# Altium footprint library custom.PcbLib: 317 footprints (part 5 of 20)
Each footprint in its own frame and in the unit in brackets; x right, y up, seen from the top. Pads: shape width x height; smd on the part's side, far side on the other; paste and mask are expansions set on the pad; w line width, h text height; cw(c..) or ccw(c..) is an arc to the next point about the centre after c.
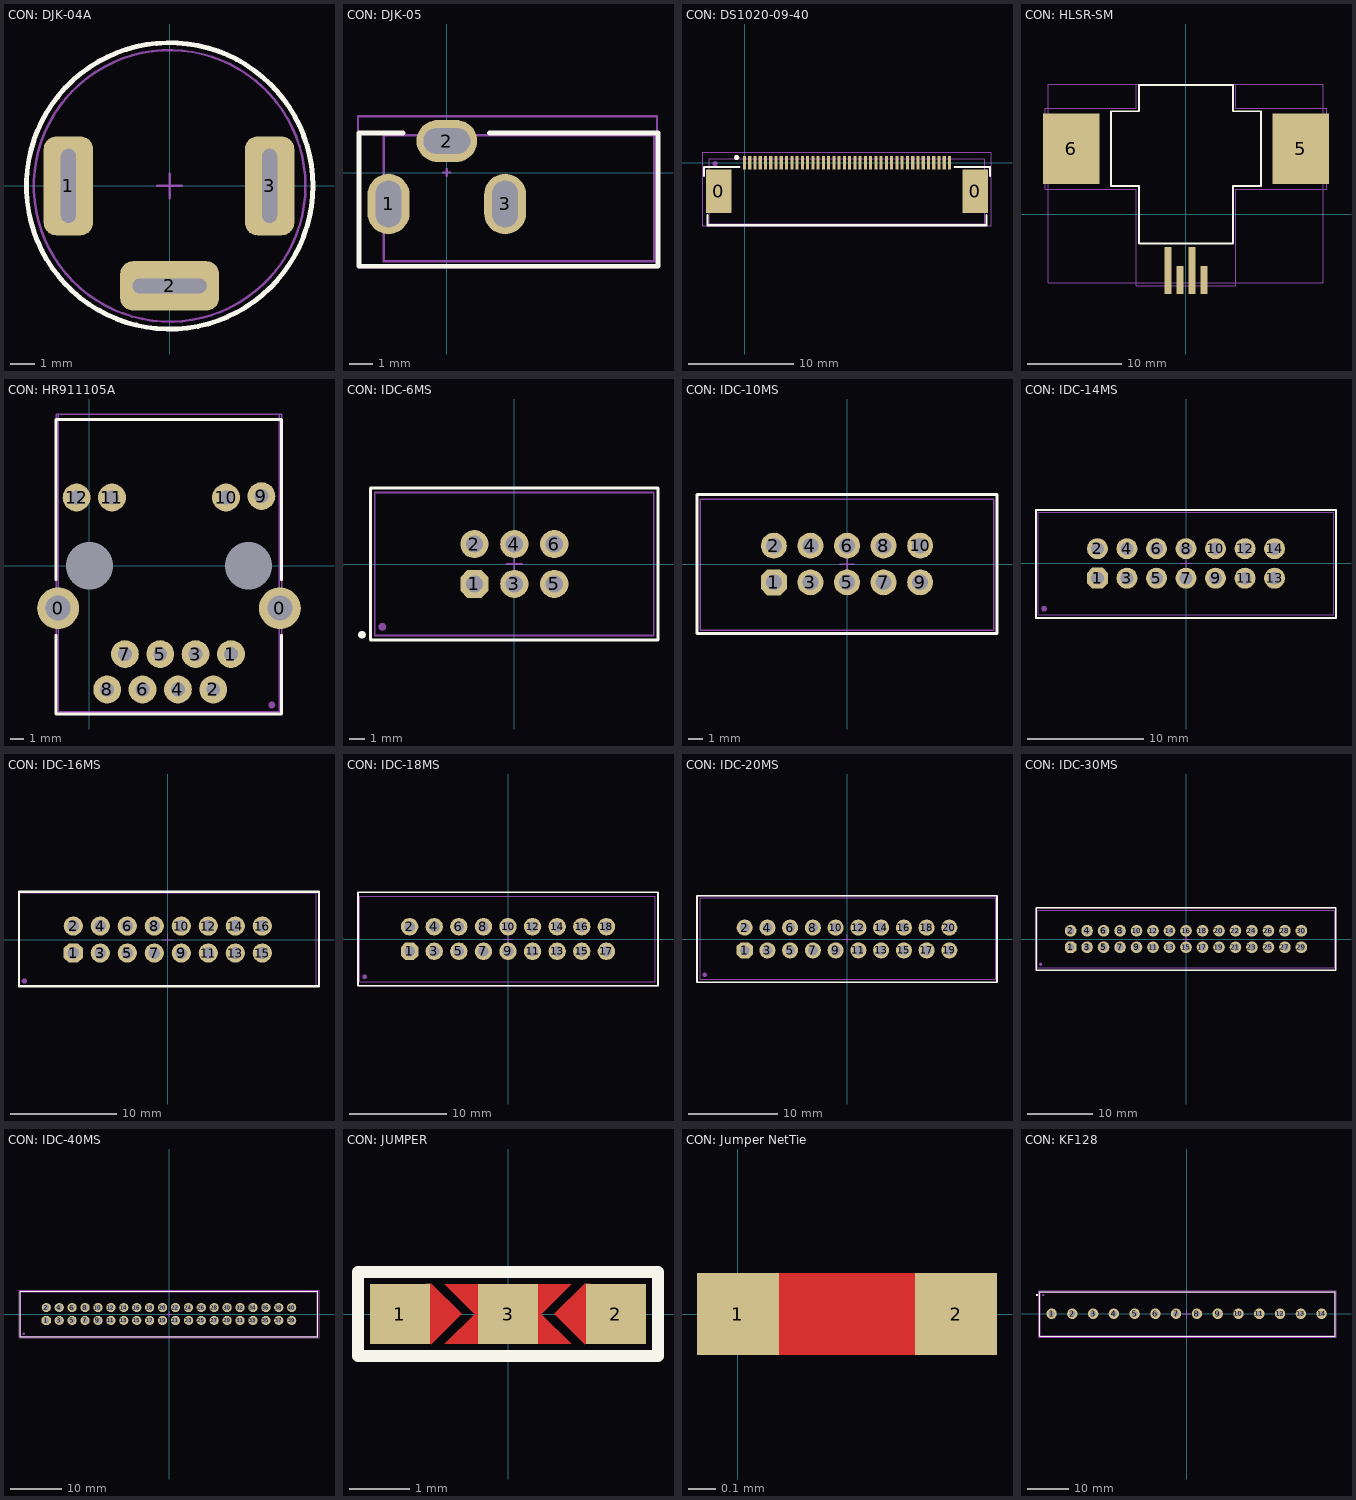
[diagram p4: the footprints below, top view; thin cyan lines are the x and y axes]

## CON: DJK-04A [mm]
height 15
pads (3):
  rrect50% 2x4 hole 0.6 slot 3 at 90 deg: 1(-4.1,0) 3(4.05,0)
  rrect50% 4x2 hole 0.6 slot 3 at 0 deg: 2(0,-4.05)
Top Overlay:
  circle w0.2: c0,0 r5.8
Top Assy:
  circle w0.1: c0,0 r5.5
Size Area:
  circle w0.1: c0,0 r5.8
  lines w0.1: -0.5,0 0.5,0 ; 0,-0.5 0,0.5
3D body "DJK-04.STEP": height 15, standoff -6, extent -5.5,-5.5 5.5,5.5

## CON: DJK-05 [mm]
height 8
pads (3):
  oval 1.8x2.6 hole 1.1 slot 2 at 90 deg: 1(-2.5,-1.35) 3(2.5,-1.35)
  oval 2.6x1.8 hole 1.1 slot 2 at 0 deg: 2(0,1.35)
Top Overlay:
  lines w0.2: -1.865,1.698 -3.77,1.698 -3.77,-4.017 9.057,-4.017 9.057,1.698 1.818,1.698
Top Assy:
  lines w0.1: -2.7,-3.8 -2.7,1.6 8.9,1.6 8.9,-3.8 -2.7,-3.8
Size Area:
  lines w0.1: -0.15,0 0.15,0 ; 0,-0.15 0,0.15 ; -3.81,-4.064 9.017,-4.064 9.017,2.413 -3.81,2.413 -3.81,-4.064
3D body "DJK-05.STEP": height 7.3, standoff -3.2, extent -2.71,-3.85 8.89,1.55

## CON: DS1020-09-40 [mm]
pads (44):
  rect 2.4x4.15 smd: 0(-2.45,-2.7) 0(21.95,-2.7)
  rect 0.3x1.25 smd: 1(0,0) 2(0.5,0) 3(1,0) 4(1.5,0) 5(2,0) 6(2.5,0) 7(3,0) 8(3.5,0) 9(4,0) 10(4.5,0) 11(5,0) 12(5.5,0) 13(6,0) 14(6.5,0) 15(7,0) 16(7.5,0) 17(8,0) 18(8.5,0) 19(9,0) 20(9.5,0) 21(10,0) 22(10.5,0) 23(11,0) 24(11.5,0) 25(12,0) 26(12.5,0) 27(13,0) 28(13.5,0) 29(14,0) 30(14.5,0) 31(15,0) 32(15.5,0) 33(16,0) 34(16.5,0) 35(17,0) 36(17.5,0) 37(18,0) 38(18.5,0) 39(19,0) 40(19.5,0)
  round 0.5 on Mech1: ""(-2.8,-0.1)
  round 0.5 on Top Overlay: ""(-0.75,0.5)
Top Overlay:
  lines w0.2: -3.875,-1.25 -3.875,-0.4 -3.85,-0.4 -3.8,-0.4 -0.5,-0.4 ; -3.525,-5 -3.525,-5.95 23,-5.95 23.025,-5.95 23.025,-5 ; 20,-0.4 23.3,-0.4 23.35,-0.4 23.375,-0.4 23.375,-1.25
Top Assy:
  lines w0.1: -3.375,-5.8 22.875,-5.8 22.875,0.4 -3.375,0.4 -3.375,-5.8
Size Area:
  lines w0.1: -4,-6 23.5,-6 23.5,1 -4,1 -4,-6
3D body "4-1734844-0.stp": height 1.88, standoff -0.02, extent -3.375,-5.8 22.875,0.4

## CON: HLSR-SM [mm] "Current transducer"
height 12.5
pads (6):
  rect 0.75x5 smd: 1(-1.905,-6) 3(0.635,-6)
  rect 0.75x3 smd: 2(-0.635,-7) 4(1.905,-7)
  rect 6x7.5 smd: 5(12.25,7) 6(-12.25,7)
Top Overlay:
  lines w0.2: -8,3 -5,3 -5,-3.1 5,-3.1 5,3 8,3 8,11 5,11 5,13.8 -5,13.8 -5,11 -8,11 -8,3
Top Assy:
  lines w0.1: -14.677,-7.325 -14.677,13.875 14.625,13.875 14.625,-7.325 -14.677,-7.325
Size Area:
  lines w0.1: -15,2.7 -15,11.3 -5.3,11.3 -5.3,13.9 5.3,13.9 5.3,11.3 15,11.3 15,2.7 5.3,2.7 5.3,-7.6 -5.3,-7.6 -5.3,2.7 -15,2.7
3D body "������ ���� HLSR 32-SM.STEP": height 12, standoff 0, extent -14.677,-7.325 14.618,13.875

## CON: HR911105A [mm]
height 14
pads (17):
  round 3 hole 1.8: 0(-2.25,-3.05) 0(13.68,-3.05)
  oval 0.7x0 hole 3.4: 0(0,0) 0(11.43,0)
  round 2 hole 1: 1(10.165,-6.35) 2(8.895,-8.89) 3(7.625,-6.35) 4(6.355,-8.89) 5(5.085,-6.35) 6(3.815,-8.89) 7(2.545,-6.35) 8(1.275,-8.89) 9(12.35,5) 10(9.81,4.9) 11(1.62,4.9) 12(-0.92,4.9)
  round 0.5 on Mech1: ""(13.1,-10)
Top Overlay:
  lines w0.2: -2.4,-5 -2.4,-10.65 13.8,-10.65 13.8,-5 ; -2.4,-1 -2.4,10.5 13.8,10.5 13.8,-1
Top Assy:
  lines w0.1: -2.24,-10.5 13.64,-10.5 13.64,10.9 -2.24,10.9 -2.24,-10.5
Size Area:
  lines w0.1: -2.4,-10.6 13.8,-10.6 13.8,10.9 -2.4,10.9 -2.4,-1 -2.4,-10.6
3D body "User Library-HR911105A.STEP": height 13.6, standoff -2.9, extent -2.24,-10.5 13.64,10.9

## CON: IDC-6MS [mm] "IDC-6MS 6 pin PCB-mount connector"
height 10
pads (8):
  oct 1.8x1.8 hole 1.1: 1(-2.54,-1.27)
  round 1.8 hole 1.1: 2(-2.54,1.27) 3(0,-1.27) 4(0,1.27) 5(2.54,-1.27) 6(2.54,1.27)
  round 0.5 on Mech1: 36(-8.4,-4)
  round 0.5 on Top Overlay: 37(-9.7,-4.5)
Top Overlay:
  lines w0.2: -9.144,-4.826 -9.144,4.826 9.144,4.826 9.144,-4.826 -9.144,-4.826
Top Assy:
  lines w0.1: -8.89,-4.55 8.87,-4.55 8.87,4.55 -8.89,4.55 -8.89,-4.55
Size Area:
  lines w0.1: -0.5,0 0.5,0 ; 0,-0.5 0,0.5 ; -9.144,-4.826 -9.144,4.826 9.144,4.826 9.144,-4.826 -9.144,-4.826
3D body "IDC-6MS.STEP": height 9, standoff -3, extent -8.89,-4.55 8.87,4.55

## CON: IDC-10MS [mm] "IDC-10MS 10 pin PCB-mount header"
height 10
pads (10):
  oct 1.8x1.8 hole 1.1: 1(-5.08,-1.27)
  round 1.8 hole 1.1: 2(-5.08,1.27) 3(-2.54,-1.27) 4(-2.54,1.27) 5(0,-1.27) 6(0,1.27) 7(2.54,-1.27) 8(2.54,1.27) 9(5.08,-1.27) 10(5.08,1.27)
Top Overlay:
  lines w0.2: -10.414,-4.826 10.414,-4.826 10.414,4.826 -10.414,4.826 -10.414,-4.826
Top Assy:
  lines w0.1: -10.2,-4.6 -10.2,4.5 10.2,4.5 10.2,-4.6 -10.2,-4.6
Size Area:
  lines w0.1: -0.5,0 0.5,0 ; 0,-0.5 0,0.5 ; -10.414,-4.826 10.414,-4.826 10.414,4.826 -10.414,4.826 -10.414,-4.826
3D body "IDC-10MS.STEP": height 9, standoff -3.1, extent -10.14,-4.572 10.16,4.528

## CON: IDC-14MS [mm] "IDC-14MS connector"
height 9
pads (15):
  oct 1.8x1.8 hole 1.1: 1(-7.62,-1.27)
  round 1.8 hole 1.1: 2(-7.62,1.27) 3(-5.08,-1.27) 4(-5.08,1.27) 5(-2.54,-1.27) 6(-2.54,1.27) 7(0,-1.27) 8(0,1.27) 9(2.54,-1.27) 10(2.54,1.27) 11(5.08,-1.27) 12(5.08,1.27) 13(7.62,-1.27) 14(7.62,1.27)
  round 0.5 on Mech1: 38(-12.2,-3.9)
Top Overlay:
  lines w0.2: -12.9,-4.7 -12.9,4.6 12.9,4.6 12.9,-4.7 -12.9,-4.7
Top Assy:
  lines w0.1: -12.7,-4.4 12.7,-4.4 12.7,4.4 -12.7,4.4 -12.7,-4.4
Size Area:
  lines w0.1: -0.5,0 0.5,0 ; 0,-0.5 0,0.5 ; -12.9,-4.7 -12.9,4.6 12.9,4.6 12.9,-4.7 -12.9,-4.7
3D body "IDC-14MS.STEP": height 9.1, standoff -3, extent -12.715,-4.4 12.715,4.4

## CON: IDC-16MS [mm] "IDC-16MS straight leads pcb mount"
height 9
pads (17):
  oct 1.8x1.8 hole 1.1: 1(-8.89,-1.27)
  round 1.8 hole 1.1: 2(-8.89,1.27) 3(-6.35,-1.27) 4(-6.35,1.27) 5(-3.81,-1.27) 6(-3.81,1.27) 7(-1.27,-1.27) 8(-1.27,1.27) 9(1.27,-1.27) 10(1.27,1.27) 11(3.81,-1.27) 12(3.81,1.27) 13(6.35,-1.27) 14(6.35,1.27) 15(8.89,-1.27) 16(8.89,1.27)
  round 0.5 on Mech1: 39(-13.5,-3.9)
Top Overlay:
  lines w0.2: -14,-4.4 -14,4.5 14.224,4.5 14.224,-4.4 -14,-4.4
Top Assy:
  lines w0.1: -13.985,-4.4 13.985,-4.4 13.985,4.4 -13.985,4.4 -13.985,4.285 -13.985,-4.4
Size Area:
  lines w0.1: -0.5,0 0.5,0 ; 0,-0.5 0,0.5 ; -14,-4.4 -14,4.5 14.224,4.5 14.224,-4.4 -14,-4.4
3D body "IDC-16MS.STEP": height 9.1, standoff -3, extent -13.985,-4.4 13.985,4.4

## CON: IDC-18MS [mm]
height 10
pads (19):
  oct 1.8x1.8 hole 1.1: 1(-10.16,-1.27)
  round 1.8 hole 1.1: 2(-10.16,1.27) 3(-7.62,-1.27) 4(-7.62,1.27) 5(-5.08,-1.27) 6(-5.08,1.27) 7(-2.54,-1.27) 8(-2.54,1.27) 9(0,-1.27) 10(0,1.27) 11(2.54,-1.27) 12(2.54,1.27) 13(5.08,-1.27) 14(5.08,1.27) 15(7.62,-1.27) 16(7.62,1.27) 17(10.16,-1.27) 18(10.16,1.27)
  round 0.5 on Mech1: 40(-14.8,-3.9)
Top Overlay:
  lines w0.2: -15.494,-4.826 -15.494,4.826 15.494,4.826 15.494,-4.826 -15.494,-4.826
Top Assy:
  lines w0.1: -15.3,-4.4 15.2,-4.4 15.2,4.4 -15.3,4.4 -15.3,-4.4
Size Area:
  lines w0.1: -0.5,0 0.5,0 ; 0,-0.5 0,0.5 ; -15.494,-4.826 -15.494,4.826 15.494,4.826 15.494,-4.826 -15.494,-4.826
3D body "IDC-18MS.STEP": height 10.54, standoff -1, extent -15.28,-4.378 15.23,4.422

## CON: IDC-20MS [mm]
height 10
pads (21):
  oct 1.8x1.8 hole 1.1: 1(-11.43,-1.27)
  round 1.8 hole 1.1: 2(-11.43,1.27) 3(-8.89,-1.27) 4(-8.89,1.27) 5(-6.35,-1.27) 6(-6.35,1.27) 7(-3.81,-1.27) 8(-3.81,1.27) 9(-1.27,-1.27) 10(-1.27,1.27) 11(1.27,-1.27) 12(1.27,1.27) 13(3.81,-1.27) 14(3.81,1.27) 15(6.35,-1.27) 16(6.35,1.27) 17(8.89,-1.27) 18(8.89,1.27) 19(11.43,-1.27) 20(11.43,1.27)
  round 0.5 on Mech1: 41(-15.9,-4)
Top Overlay:
  lines w0.2: -16.764,-4.826 16.764,-4.826 16.764,4.826 -16.764,4.826 -16.764,-4.826
Top Assy:
  lines w0.1: -16.4,-4.5 -16.4,4.6 16.6,4.6 16.6,-4.5 -16.4,-4.5
Size Area:
  lines w0.1: -0.5,0 0.5,0 ; 0,-0.5 0,0.5 ; -16.764,-4.826 16.764,-4.826 16.764,4.826 -16.764,4.826 -16.764,-4.826
3D body "IDC-20MS.STEP": height 9, standoff -3, extent -16.43,-4.52 16.57,4.58

## CON: IDC-30MS [mm]
height 10
pads (31):
  oct 1.8x1.8 hole 1.1: 1(-17.78,-1.27)
  round 1.8 hole 1.1: 2(-17.78,1.27) 3(-15.24,-1.27) 4(-15.24,1.27) 5(-12.7,-1.27) 6(-12.7,1.27) 7(-10.16,-1.27) 8(-10.16,1.27) 9(-7.62,-1.27) 10(-7.62,1.27) 11(-5.08,-1.27) 12(-5.08,1.27) 13(-2.54,-1.27) 14(-2.54,1.27) 15(0,-1.27) 16(0,1.27) 17(2.54,-1.27) 18(2.54,1.27) 19(5.08,-1.27) 20(5.08,1.27) 21(7.62,-1.27) 22(7.62,1.27) 23(10.16,-1.27) 24(10.16,1.27) 25(12.7,-1.27) 26(12.7,1.27) 27(15.24,-1.27) 28(15.24,1.27) 29(17.78,-1.27) 30(17.78,1.27)
  round 0.5 on Mech1: 42(-22.4,-3.9)
Top Overlay:
  lines w0.2: -23.114,-4.826 -23.114,4.826 23.114,4.826 23.114,-4.826 -23.114,-4.826
Top Assy:
  lines w0.1: -22.9,-4.4 22.9,-4.4 22.9,4.4 -22.9,4.4 -22.9,-4.4
Size Area:
  lines w0.1: -0.5,0 0.5,0 ; 0,-0.5 0,0.5 ; -23.114,-4.826 -23.114,4.826 23.114,4.826 23.114,-4.826 -23.114,-4.826
3D body "IDC-30MS.STEP": height 8.78, standoff -3, extent -22.881,-4.392 22.869,4.408

## CON: IDC-40MS [mm]
height 10
pads (41):
  oct 1.8x1.8 hole 1.1: 1(-24.13,-1.27)
  round 1.8 hole 1.1: 2(-24.13,1.27) 3(-21.59,-1.27) 4(-21.59,1.27) 5(-19.05,-1.27) 6(-19.05,1.27) 7(-16.51,-1.27) 8(-16.51,1.27) 9(-13.97,-1.27) 10(-13.97,1.27) 11(-11.43,-1.27) 12(-11.43,1.27) 13(-8.89,-1.27) 14(-8.89,1.27) 15(-6.35,-1.27) 16(-6.35,1.27) 17(-3.81,-1.27) 18(-3.81,1.27) 19(-1.27,-1.27) 20(-1.27,1.27) 21(1.27,-1.27) 22(1.27,1.27) 23(3.87,-1.27) 24(3.81,1.27) 25(6.35,-1.27) 26(6.35,1.27) 27(8.89,-1.27) 28(8.89,1.27) 29(11.43,-1.27) 30(11.43,1.27) 31(13.97,-1.27) 32(13.97,1.27) 33(16.51,-1.27) 34(16.51,1.27) 35(19.05,-1.27) 36(19.05,1.27) 37(21.59,-1.27) 38(21.59,1.27) 39(24.13,-1.27) 40(24.13,1.27)
  round 0.5 on Mech1: 43(-28.6,-3.9)
Top Overlay:
  lines w0.2: -29.3,-4.5 -29.3,4.5 29.3,4.5 29.3,-4.5 -29.3,-4.5
Top Assy:
  lines w0.1: -29.2,-4.4 29.2,-4.4 29.2,4.4 -29.2,4.4 -29.2,-4.4
Size Area:
  lines w0.1: -0.5,0 0.5,0 ; 0,-0.5 0,0.5 ; -29.5,-4.7 -29.5,4.7 29.5,4.7 29.5,-4.7 -29.5,-4.7
3D body "IDC-40MS.STEP": height 8.78, standoff -3, extent -29.225,-4.4 29.225,4.4

## CON: JUMPER [mm]
pads (3):
  rect 1x1 smd: 1(-1.8,0) 2(1.8,0) 3(0,0)
Top Layer:
  region: 1.375,0.5 1.275,0.5 0.775,0 1.275,-0.5 1.375,-0.5
  region: 1.05,0.5 0.55,0 1.05,-0.5 0.45,-0.5 0.45,0.5
  region: -1.375,0.5 -1.275,0.5 -0.775,0 -1.275,-0.5 -1.375,-0.5
  region: -1.05,0.5 -0.55,0 -1.05,-0.5 -0.45,-0.5 -0.45,0.5
Top Overlay:
  lines w0.2: -2.5,-0.7 -2.5,0.7 2.5,0.7 2.5,-0.7 -2.5,-0.7
Top Solder:
  region: -1.2,0.6 1.2,0.6 1.2,-0.6 -1.2,-0.6
Top Assy:
  lines w0.1: -2.5,-0.7 2.5,-0.7 2.5,0.7 -2.5,0.7 -2.5,-0.7

## CON: Jumper NetTie [mm]
pads (2):
  rect 0.3x0.3 smd mask+0.102: 1(0,0) 2(0.8,0)
Top Layer:
  lines w0.3: 0,0 0.8,0

## CON: KF128 [mm]
height 1.5
pads (16):
  round 2.5 hole 1.4: 1(-32.5,0) 2(-27.5,0) 3(-22.5,0) 4(-17.5,0) 5(-12.5,0) 6(-7.5,0) 7(-2.54,0) 8(2.5,0) 9(7.5,0) 10(12.5,0) 11(17.5,0) 12(22.5,0) 13(27.5,0) 14(32.5,0)
  round 0.5 on Mech1: 15(-34.5,4.5)
  round 0.5 on Top Overlay: 16(-36,4.5)
Top Overlay:
  lines w0.2: -35.375,-5.475 35.8,-5.475 35.8,5.35 -35.375,5.35 -35.375,-5.475
Top Assy:
  lines w0.1: -35.22,-5.3 -35.22,5.2 35.68,5.2 35.68,-5.3 -35.22,-5.3
Size Area:
  lines w0.1: -1,0 1,0 ; 0,-1 0,1 ; -35.55,-5.65 35.975,-5.65 35.975,5.525 -35.55,5.525 -35.55,-5.65
3D body "User Library-TER-KF128-3P.STEP": height 14.45, standoff -4.85, extent -35.22,-5.3 -19.38,5.2
3D body "User Library-TER-KF128-3P.STEP": height 14.45, standoff -4.85, extent -20.02,-5.3 -4.18,5.2
3D body "User Library-TER-KF128-3P.STEP": height 14.45, standoff -4.85, extent -5.12,-5.3 10.72,5.2
3D body "User Library-TER-KF128-3P.STEP": height 14.45, standoff -4.85, extent 9.78,-5.3 25.62,5.2
3D body "User Library-TER-KF128-2P.STEP": height 14.45, standoff -4.85, extent 24.92,-5.3 35.68,5.2